# Altium footprint library STM32F0.PcbLib: 228 footprints (part 15 of 16)
Each footprint in its own frame and in the unit in brackets; x right, y up, seen from the top. Pads: shape width x height; smd on the part's side, far side on the other; paste and mask are expansions set on the pad; w line width, h text height; cw(c..) or ccw(c..) is an arc to the next point about the centre after c.
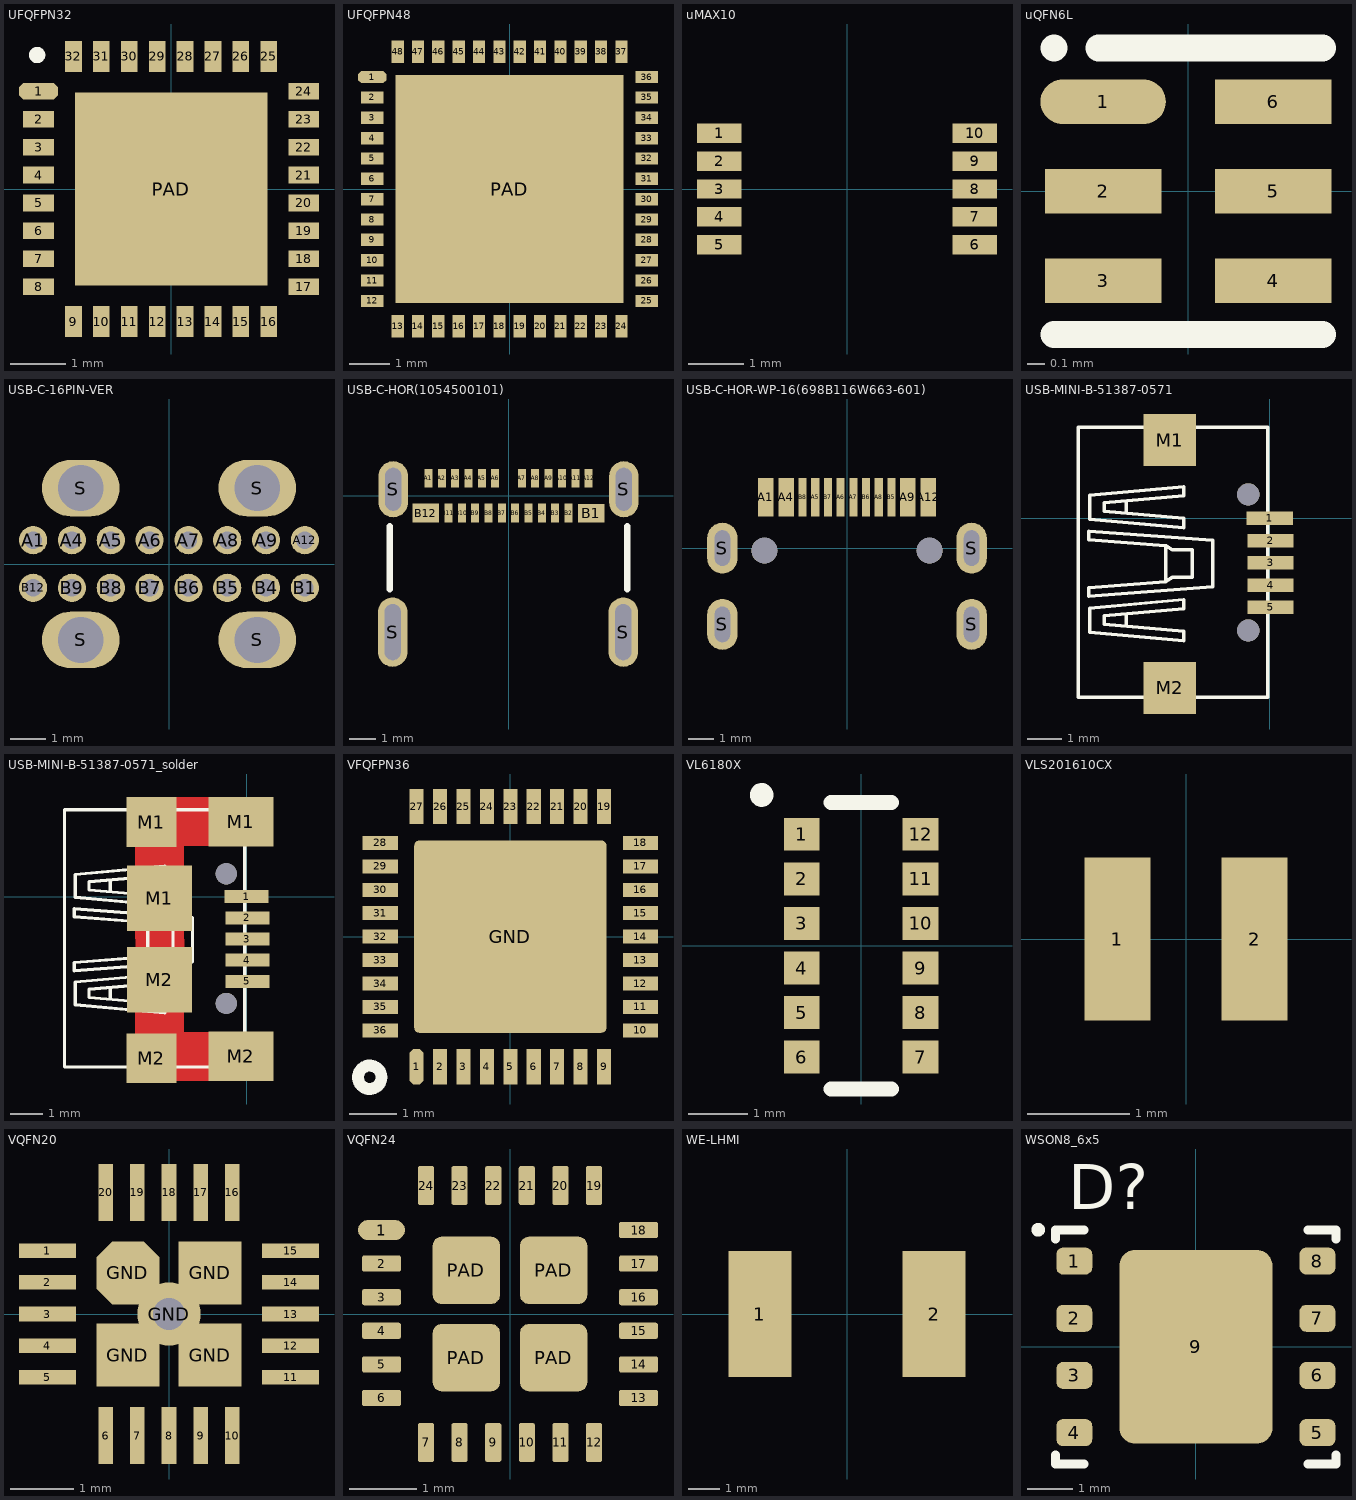
[diagram p14: the footprints below, top view; thin cyan lines are the x and y axes]

## UFQFPN32 [mm]
pads (33):
  oct 0.7x0.3 smd: 1(-2.375,1.75)
  rect 0.55x0.3 smd: 2(-2.375,1.25) 3(-2.375,0.75) 4(-2.375,0.25) 5(-2.375,-0.25) 6(-2.375,-0.75) 7(-2.375,-1.25) 8(-2.375,-1.75) 17(2.375,-1.75) 18(2.375,-1.25) 19(2.375,-0.75) 20(2.375,-0.25) 21(2.375,0.25) 22(2.375,0.75) 23(2.375,1.25) 24(2.375,1.75)
  rect 0.3x0.55 smd: 9(-1.75,-2.375) 10(-1.25,-2.375) 11(-0.75,-2.375) 12(-0.25,-2.375) 13(0.25,-2.375) 14(0.75,-2.375) 15(1.25,-2.375) 16(1.75,-2.375) 25(1.75,2.375) 26(1.25,2.375) 27(0.75,2.375) 28(0.25,2.375) 29(-0.25,2.375) 30(-0.75,2.375) 31(-1.25,2.375) 32(-1.75,2.375)
  rect 3.45x3.45 smd: PAD(0,0)
Top Overlay:
  circle w0.15: c-2.4,2.4 r0.071
3D body "User Library-UFQFPN-32.step": height 0.55, standoff 0, extent -2.5,-2.5 2.5,2.5

## UFQFPN48 [mm]
pads (49):
  oct 0.7x0.3 smd: 1(-3.375,2.75)
  rect 0.55x0.3 smd: 2(-3.375,2.25) 3(-3.375,1.75) 4(-3.375,1.25) 5(-3.375,0.75) 6(-3.375,0.25) 7(-3.375,-0.25) 8(-3.375,-0.75) 9(-3.375,-1.25) 10(-3.375,-1.75) 11(-3.375,-2.25) 12(-3.375,-2.75) 25(3.375,-2.75) 26(3.375,-2.25) 27(3.375,-1.75) 28(3.375,-1.25) 29(3.375,-0.75) 30(3.375,-0.25) 31(3.375,0.25) 32(3.375,0.75) 33(3.375,1.25) 34(3.375,1.75) 35(3.375,2.25) 36(3.375,2.75)
  rect 0.3x0.55 smd: 13(-2.75,-3.375) 14(-2.25,-3.375) 15(-1.75,-3.375) 16(-1.25,-3.375) 17(-0.75,-3.375) 18(-0.25,-3.375) 19(0.25,-3.375) 20(0.75,-3.375) 21(1.25,-3.375) 22(1.75,-3.375) 23(2.25,-3.375) 24(2.75,-3.375) 37(2.75,3.375) 38(2.25,3.375) 39(1.75,3.375) 40(1.25,3.375) 41(0.75,3.375) 42(0.25,3.375) 43(-0.25,3.375) 44(-0.75,3.375) 45(-1.25,3.375) 46(-1.75,3.375) 47(-2.25,3.375) 48(-2.75,3.375)
  rect 5.6x5.6 smd: PAD(0,0)
3D body "User Library-UFQFPN48.step": height 0.55, standoff 0, extent -3.5,-3.5 3.5,3.5

## uMAX10 [mm]
pads (10):
  rect 0.8x0.35 smd: 1(-2.3,1) 2(-2.3,0.5) 3(-2.3,0) 4(-2.3,-0.5) 5(-2.3,-1) 6(2.3,-1) 7(2.3,-0.5) 8(2.3,0) 9(2.3,0.5) 10(2.3,1)
3D body "User Library-uMAX10-1.step": height 1.1, standoff 0, extent -2.542,-1.525 2.543,1.525

## uQFN6L [mm]
pads (6):
  oval 0.7x0.25 smd: 1(-0.475,0.5)
  rect 0.65x0.25 smd: 2(-0.475,0) 3(-0.475,-0.5) 4(0.475,-0.5) 5(0.475,0) 6(0.475,0.5)
Top Overlay:
  lines w0.15: -0.75,-0.8 0.75,-0.8 ; -0.5,0.8 0.75,0.8 ; -0.75,0.8 -0.75,0.8
3D body "User Library-QFN-6L.step": height 0.5, standoff 0, extent -0.75,-0.85 0.75,0.85

## USB-C-16PIN-VER [mm]
pads (20):
  round 0.8 hole 0.5: A1(-3.85,0.675) A4(-2.75,0.675) A5(-1.65,0.675) A6(-0.55,0.675) A7(0.55,0.675) A8(1.65,0.675) A9(2.75,0.675) A12(3.85,0.675) B1(3.85,-0.675) B4(2.75,-0.675) B5(1.65,-0.675) B6(0.55,-0.675) B7(-0.55,-0.675) B8(-1.65,-0.675) B9(-2.75,-0.675) B12(-3.85,-0.675)
  oval 2.2x1.6 hole 1.3: S(-2.5,-2.15) S(-2.5,2.15) S(2.5,-2.15) S(2.5,2.15)

## USB-C-HOR(1054500101) [mm]
pads (28):
  rect 0.3x0.7 smd: A1(-3,0.655) A2(-2.5,0.655) A3(-2,0.655) A4(-1.5,0.655) A5(-1,0.655) A6(-0.5,0.655) A7(0.5,0.655) A8(1,0.655) A9(1.5,0.655) A10(2,0.655) A11(2.5,0.655) A12(3,0.655) B2(2.25,-0.645) B3(1.75,-0.645) B4(1.25,-0.645) B5(0.75,-0.645) B6(0.25,-0.645) B7(-0.25,-0.645) B8(-0.75,-0.645) B9(-1.25,-0.645) B10(-1.75,-0.645) B11(-2.25,-0.645)
  rect 1x0.7 smd: B1(3.1,-0.655) B12(-3.1,-0.645)
  oval 1.1x2.6 hole 2.1 slot 0.6 at 0 deg unplated: S(-4.34,-5.105) S(4.3,-5.105)
  oval 1.1x2.1 hole 1.6 slot 0.6 at 0 deg unplated: S(-4.32,0.245) S(4.32,0.245)
Top Overlay:
  lines w0.254: -4.45,-3.5 -4.45,-1.15 ; 4.45,-3.5 4.45,-1.15
3D body "Molex - 1054500101 v7.step": height 3.21, standoff -0.75, extent -4.47,-7.065 4.47,0.835

## USB-C-HOR-WP-16(698B116W663-601) [mm]
pads (18):
  rect 0.61x1.5 smd: A1(-3.195,2) A4(-2.395,2) A9(2.395,2) A12(3.195,2)
  rect 0.32x1.5 smd: A5(-1.25,2) A6(-0.25,2) A7(0.25,2) A8(1.25,2) B5(1.75,2) B6(0.75,2) B7(-0.75,2) B8(-1.75,2)
  oval 1.2x2 hole 0.6 slot 1.4 at 90 deg: S(-4.9,-3) S(-4.9,0) S(4.9,-3) S(4.9,0)
  round 1.02 hole 1.02 unplated: ""(-3.25,-0.1) ""(3.25,-0.1)
3D body "698b116w663-601.STEP": height 4.82, standoff -1.18, extent -5.335,-6.608 5.305,2.092

## USB-MINI-B-51387-0571 [mm] "MOLEX 51387-0571"
pads (9):
  rect 1.35x0.4 smd: 1(0,0) 2(0.025,-0.65) 3(0.025,-1.3) 4(0.025,-1.95) 5(0.025,-2.6)
  rect 1.524x1.524 smd: M1(-2.921,2.286) M2(-2.921,-4.953)
  round 0.65 hole 0.65 unplated: ""(-0.625,-3.275) ""(-0.625,0.7)
Top Overlay:
  lines w0.102: -4.835,-2.871 -4.835,-3.096 -2.51,-3.296 -2.51,-3.571 -5.26,-3.321 -5.26,-2.621 -2.51,-2.371 -2.51,-2.646 -4.835,-2.846 ; -4.835,0.204 -2.51,0.004 -2.51,-0.271 -5.26,-0.021 -5.26,0.679 -2.51,0.929 -2.51,0.654 -4.835,0.454 -4.835,0.229 ; -4.185,-3.121 -4.185,-2.846 ; -4.185,0.204 -4.185,0.479 ; -3.035,-1.846 -5.285,-2.021 -5.285,-2.271 -1.66,-1.996 -1.66,-1.321 -1.66,-0.646 -5.285,-0.371 -5.285,-0.621 -3.035,-0.796 ; -3.035,-1.846 -2.835,-1.721 -2.26,-1.721 -2.26,-1.321 -2.26,-0.921 -2.835,-0.921 -3.035,-0.796 ; -3.035,-1.846 -3.035,-1.321 -3.035,-0.796 ; -5.588,-5.225 -0.056,-5.225 -0.056,2.667 -5.588,2.667 -5.588,-5.225
3D body "User Library-10118192C.step": height 2.74, standoff -0.27, extent -5.635,-5.256 0.025,2.656

## USB-MINI-B-51387-0571_solder [mm] "MOLEX 51387-0571"
pads (13):
  rect 1.35x0.4 smd: 1(0,0) 2(0.025,-0.65) 3(0.025,-1.3) 4(0.025,-1.95) 5(0.025,-2.6)
  rect 1.524x1.524 smd: M1(-2.921,2.286) M2(-2.921,-4.953)
  rect 2x2 smd: M1(-2.675,-0.05) M2(-2.675,-2.55)
  rect 2x1.524 smd: M1(-0.175,2.3) M2(-0.175,-4.9)
  round 0.65 hole 0.65 unplated: ""(-0.625,-3.275) ""(-0.625,0.7)
Top Layer:
  lines w1.5: -2.675,-2.55 -2.675,-4.9 -0.175,-4.9 ; -2.662,-2.55 -2.675,-0.05 -2.675,2.3 -0.175,2.3
Top Overlay:
  lines w0.102: -4.835,-2.871 -4.835,-3.096 -2.51,-3.296 -2.51,-3.571 -5.26,-3.321 -5.26,-2.621 -2.51,-2.371 -2.51,-2.646 -4.835,-2.846 ; -4.835,0.204 -2.51,0.004 -2.51,-0.271 -5.26,-0.021 -5.26,0.679 -2.51,0.929 -2.51,0.654 -4.835,0.454 -4.835,0.229 ; -4.185,-3.121 -4.185,-2.846 ; -4.185,0.204 -4.185,0.479 ; -3.035,-1.846 -5.285,-2.021 -5.285,-2.271 -1.66,-1.996 -1.66,-1.321 -1.66,-0.646 -5.285,-0.371 -5.285,-0.621 -3.035,-0.796 ; -3.035,-1.846 -2.835,-1.721 -2.26,-1.721 -2.26,-1.321 -2.26,-0.921 -2.835,-0.921 -3.035,-0.796 ; -3.035,-1.846 -3.035,-1.321 -3.035,-0.796 ; -5.588,-5.225 -0.056,-5.225 -0.056,2.667 -5.588,2.667 -5.588,-5.225
3D body "User Library-10118192C.step": height 2.74, standoff -0.27, extent -5.635,-5.256 0.025,2.656

## VFQFPN36 [mm]
pads (37):
  oct 0.3x0.75 smd: 1(-2,-2.775)
  rect 0.3x0.75 smd: 2(-1.5,-2.775) 3(-1,-2.775) 4(-0.5,-2.775) 5(0,-2.775) 6(0.5,-2.775) 7(1,-2.775) 8(1.5,-2.775) 9(2,-2.775) 19(2,2.775) 20(1.5,2.775) 21(1,2.775) 22(0.5,2.775) 23(0,2.775) 24(-0.5,2.775) 25(-1,2.775) 26(-1.5,2.775) 27(-2,2.775)
  rect 0.75x0.3 smd: 10(2.775,-2) 11(2.775,-1.5) 12(2.775,-1) 13(2.775,-0.5) 14(2.775,0) 15(2.775,0.5) 16(2.775,1) 17(2.775,1.5) 18(2.775,2) 28(-2.775,2) 29(-2.775,1.5) 30(-2.775,1) 31(-2.775,0.5) 32(-2.775,0) 33(-2.775,-0.5) 34(-2.775,-1) 35(-2.775,-1.5) 36(-2.775,-2)
  rrect5% 4.1x4.1 smd: GND(0,0)
Top Overlay:
  circle w0.254: c-3,-3 r0.25
3D body "User Library-TQFN-36.STEP": height 0.8, standoff 0, extent -3.06,-3.06 3.06,3.06

## VL6180X [mm]
pads (12):
  rect 0.6x0.55 smd: 1(-1,1.875) 2(-1,1.125) 3(-1,0.375) 4(-1,-0.375) 5(-1,-1.125) 6(-1,-1.875) 7(1,-1.875) 8(1,-1.125) 9(1,-0.375) 10(1,0.375) 11(1,1.125) 12(1,1.875)
Top Overlay:
  circle w0.2: c-1.676,2.54 r0.1
  lines w0.254: -0.508,-2.413 0.508,-2.413 ; -0.508,2.413 0.508,2.413
3D body "User Library-VL6180X.step": height 1.01, standoff -0.01, extent -1.4,-2.4 1.4,2.4

## VLS201610CX [mm]
pads (2):
  rect 0.65x1.6 smd: 1(-0.675,0) 2(0.675,0)
3D body "User Library-TDK__VLS201610CX_series__Body2_0x1_6x1_0mm.step": height 1, standoff 0, extent -1,-0.8 1,0.8

## VQFN20 [mm]
pads (25):
  rect 0.9x0.23 smd: 1(-1.925,1) 2(-1.925,0.5) 3(-1.925,0) 4(-1.925,-0.5) 5(-1.925,-1) 11(1.925,-1) 12(1.925,-0.5) 13(1.925,0) 14(1.925,0.5) 15(1.925,1)
  rect 0.23x0.9 smd: 6(-1,-1.925) 7(-0.5,-1.925) 8(0,-1.925) 9(0.5,-1.925) 10(1,-1.925) 16(1,1.925) 17(0.5,1.925) 18(0,1.925) 19(-0.5,1.925) 20(-1,1.925)
  rect 1x1 smd: GND(-0.65,-0.65) GND(0.65,-0.65) GND(0.65,0.65)
  oct 1x1 smd: GND(-0.65,0.65)
  round 1 hole 0.5: GND(0,0)
3D body "User Library-QFN20_4x4x0_8.step": height 0.78, standoff -0.02, extent -2.01,-2.01 2.01,2.01

## VQFN24 [mm]
pads (28):
  oval 0.7x0.3 smd: 1(-1.913,1.25)
  rrect25% 0.58x0.24 smd: 2(-1.913,0.75) 3(-1.913,0.25) 4(-1.913,-0.25) 5(-1.913,-0.75) 6(-1.913,-1.25) 13(1.913,-1.25) 14(1.913,-0.75) 15(1.913,-0.25) 16(1.913,0.25) 17(1.913,0.75) 18(1.913,1.25)
  rrect25% 0.24x0.58 smd: 7(-1.25,-1.913) 8(-0.75,-1.913) 9(-0.25,-1.913) 10(0.25,-1.913) 11(0.75,-1.913) 12(1.25,-1.913) 19(1.25,1.913) 20(0.75,1.913) 21(0.25,1.913) 22(-0.25,1.913) 23(-0.75,1.913) 24(-1.25,1.913)
  rrect25% 1x1 smd: PAD(-0.65,-0.65) PAD(-0.65,0.65) PAD(0.65,-0.65) PAD(0.65,0.65)
3D body "User Library-VQFN-24.step": height 1, standoff -0.07, extent -2.05,-2.05 2.05,2.05

## WE-LHMI [mm]
pads (2):
  rect 2x4 smd: 1(-2.763,0) 2(2.763,0)
3D body "44806.stp": height 2.7, standoff -0.1, extent -3.65,-3.3 3.65,3.3

## WSON8_6x5 [mm] "WSON, 8-Leads, Body 6x5mm, Pitch 1.27mm, Thermal Pad 3.4x4.3mm"
height 0.75
pads (9):
  rrect50% 0.8x0.6 smd: 1(-2.7,1.905) 2(-2.7,0.635) 3(-2.7,-0.635) 4(-2.7,-1.905) 5(2.7,-1.905) 6(2.7,-0.635) 7(2.7,0.635) 8(2.7,1.905)
  rrect20% 3.4x4.3 smd paste+0 mask+0: 9(0,0)
Top Overlay:
  circle w0.2: c-3.5,2.6 r0.05
  lines w0.2: -3.112,-2.4 -3.112,-2.6 -2.488,-2.6 ; -3.112,2.4 -3.112,2.6 -2.488,2.6 ; 2.488,-2.6 3.112,-2.6 3.112,-2.4 ; 2.488,2.6 3.112,2.6 3.112,2.4
  text "D?" at -2.83,3.06 h1
3D body "WSON8_6x5.STEP": height 0.8, standoff 0, extent -2.999,-2.5 3.001,2.5